# Altium footprint library Pcb sensors Lib1.PcbLib: 9 footprints
Each footprint in its own frame and in the unit in brackets; x right, y up, seen from the top. Pads: shape width x height; smd on the part's side, far side on the other; paste and mask are expansions set on the pad; w line width, h text height; cw(c..) or ccw(c..) is an arc to the next point about the centre after c.
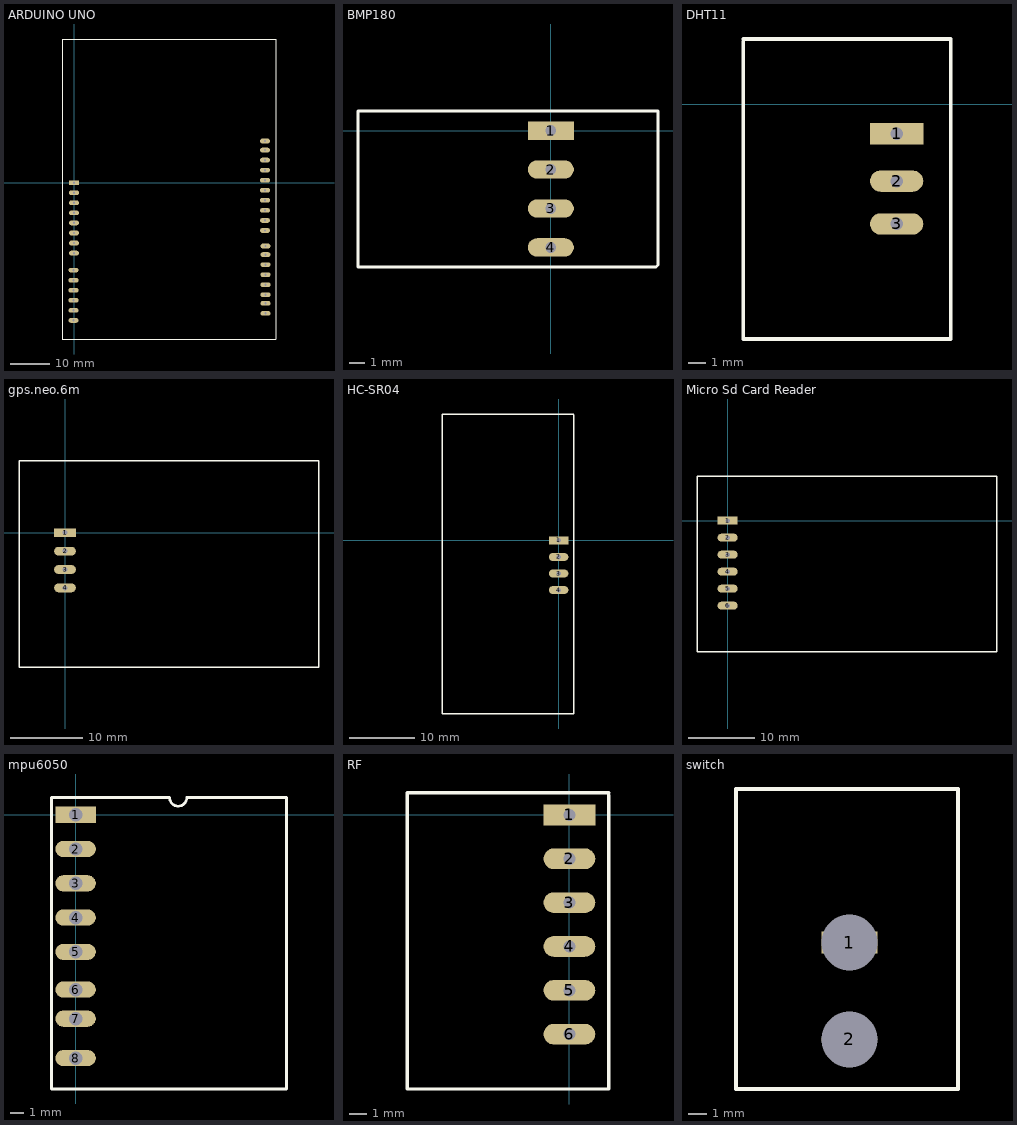
[diagram p0: the footprints below, top view; thin cyan lines are the x and y axes]

## ARDUINO UNO [mm]
pads (32):
  rect 2.5x1.2 hole 0.6: 1(0,0)
  oval 2.5x1.2 hole 0.6: 2(0,-2.54) 3(0,-5.08) 4(0,-7.62) 5(0,-10.16) 6(0,-12.7) 7(0,-15.24) 8(0,-17.78) 9(-0.127,-22.098) 10(-0.127,-24.638) 11(-0.127,-27.178) 12(-0.127,-29.718) 13(-0.127,-32.258) 14(-0.127,-34.798) 15(48.387,-33.02) 16(48.387,-30.48) 17(48.387,-28.321) 18(48.387,-25.781) 19(48.387,-23.241) 20(48.387,-20.701) 21(48.387,-18.161) 22(48.387,-16.002) 23(48.26,-12.065) 24(48.26,-9.525) 25(48.26,-6.985) 26(48.26,-4.445) 27(48.26,-1.905) 28(48.26,0.635) 29(48.26,3.175) 30(48.26,5.715) 31(48.26,8.255) 32(48.26,10.541)
Top Overlay:
  lines w0.2: 8.235,36.322 50.927,36.322 50.927,-39.497 -2.921,-39.497 -2.921,36.322 8.255,36.322
3D body "UNO_PCB.step": height 2.49, standoff -13.7, extent -2.921,-39.129 50.674,36.081

## BMP180 [mm]
pads (4):
  rect 3x1.2 hole 0.7: 1(0,0)
  oval 3x1.2 hole 0.7: 2(0,-2.54) 3(0,-5.08) 4(0,-7.62)
Top Overlay:
  lines w0.2: 6.965,1.27 -12.573,1.27 -12.573,-8.89 6.858,-8.89 6.985,-8.763 6.985,-6.966 6.985,1.27
3D body "AZDelivery GY-68 BMP-180 v4.step": height 5.67, standoff -5.88, extent -11.829,-8.92 1.161,1.3

## DHT11 [mm]
pads (3):
  rect 3x1.2 hole 0.7: 1(23.241,-1.651)
  oval 3x1.2 hole 0.7: 2(23.241,-4.318) 3(23.241,-6.731)
Top Overlay:
  lines w0.2: 14.605,3.556 14.605,-13.208 26.289,-13.208 26.289,3.683 14.605,3.683
3D body "KY-015.step": height 20.72, standoff -6.98, extent 15.503,-12.572 24.003,3.428

## gps.neo.6m [mm]
pads (4):
  rect 3x1.2 hole 0.7: 1(0,0)
  oval 3x1.2 hole 0.7: 2(0,-2.54) 3(0,-5.08) 4(0,-7.62)
Top Overlay:
  lines w0.2: -6.35,-18.542 -6.35,9.906 35.052,9.906 35.052,-18.542 11.987,-18.542 -6.35,-18.542
3D body "NEO-6M.STEP": height 6.12, standoff -5.82, extent -1.778,-17.45 33.782,8.89

## HC-SR04 [mm]
pads (4):
  rect 3x1.2 hole 0.7: 1(0,0)
  oval 3x1.2 hole 0.7: 2(0,-2.54) 3(0,-5.08) 4(0,-7.62)
Top Overlay:
  lines w0.2: 2.286,19.431 -17.907,19.431 -17.907,-26.67 2.335,-26.67 2.335,-10.16 2.335,-2.286 2.335,19.304
3D body "HC05_Modulo.STEP": height 3.14, standoff -38.38, extent -48.728,19.558 -39.37,35.308

## Micro Sd Card Reader [mm]
pads (6):
  rect 3x1.2 hole 0.7: 1(0,0)
  oval 3x1.2 hole 0.7: 2(0,-2.54) 3(0,-5.08) 4(0,-7.62) 5(0,-10.16) 6(0,-12.7)
Top Overlay:
  lines w0.2: 8.235,6.604 40.259,6.604 40.259,-19.558 -4.572,-19.558 -4.572,6.604 8.255,6.604
3D body "Product_TF Micro SD Card Memory Modul Arduino.STEP": height 5.63, standoff -5.83, extent -2.921,-18.412 38.879,5.588

## mpu6050 [mm]
pads (8):
  rect 3x1.2 hole 1: 1(0,0)
  oval 3x1.2 hole 1: 2(0,-2.54) 3(0,-5.08) 4(0,-7.62) 5(0,-10.16) 6(0,-12.954) 7(0,-15.113) 8(0,-18.034)
Top Overlay:
  lines w0.2: -1.778,-20.32 15.621,-20.32 15.621,1.27 8.235,1.27 cw(c7.6,1.27) 6.965,1.27 -1.778,1.27 -1.778,-20.32
3D body "MPU-6050-on-female-header.step": height 14.61, standoff -2.95, extent -0.762,-19.698 15.113,1.41

## RF [mm]
pads (6):
  rect 3x1.2 hole 0.7: 1(0,0)
  oval 3x1.2 hole 0.7: 2(0,-2.54) 3(0,-5.08) 4(0,-7.62) 5(0,-10.16) 6(0,-12.7)
Top Overlay:
  lines w0.2: -9.271,1.27 2.286,1.27 ; -9.017,1.27 -9.398,1.27 -9.398,-15.875 2.286,-15.875 2.286,1.143
3D body "HC05_Modulo.STEP": height 34.93, standoff -6.59, extent -8.509,-14.224 0.849,1.526

## switch [mm]
pads (2):
  rect 3x1.2 hole 3: 1(-30.988,-13.081)
  oval 3x1.2 hole 3: 2(-30.988,-18.288)
Top Overlay:
  lines w0.2: -37.084,-20.955 -37.084,-4.826 -25.146,-4.826 -25.146,-20.955 -37.084,-20.955
3D body "small_MA_switch_b.step": height 16.25, standoff -4.2, extent -36.281,-20.2 -25.781,-5.2